# Altium footprint library PcbLib1.PcbLib: 28 footprints (part 1 of 2)
Each footprint in its own frame and in the unit in brackets; x right, y up, seen from the top. Pads: shape width x height; smd on the part's side, far side on the other; paste and mask are expansions set on the pad; w line width, h text height; cw(c..) or ccw(c..) is an arc to the next point about the centre after c.
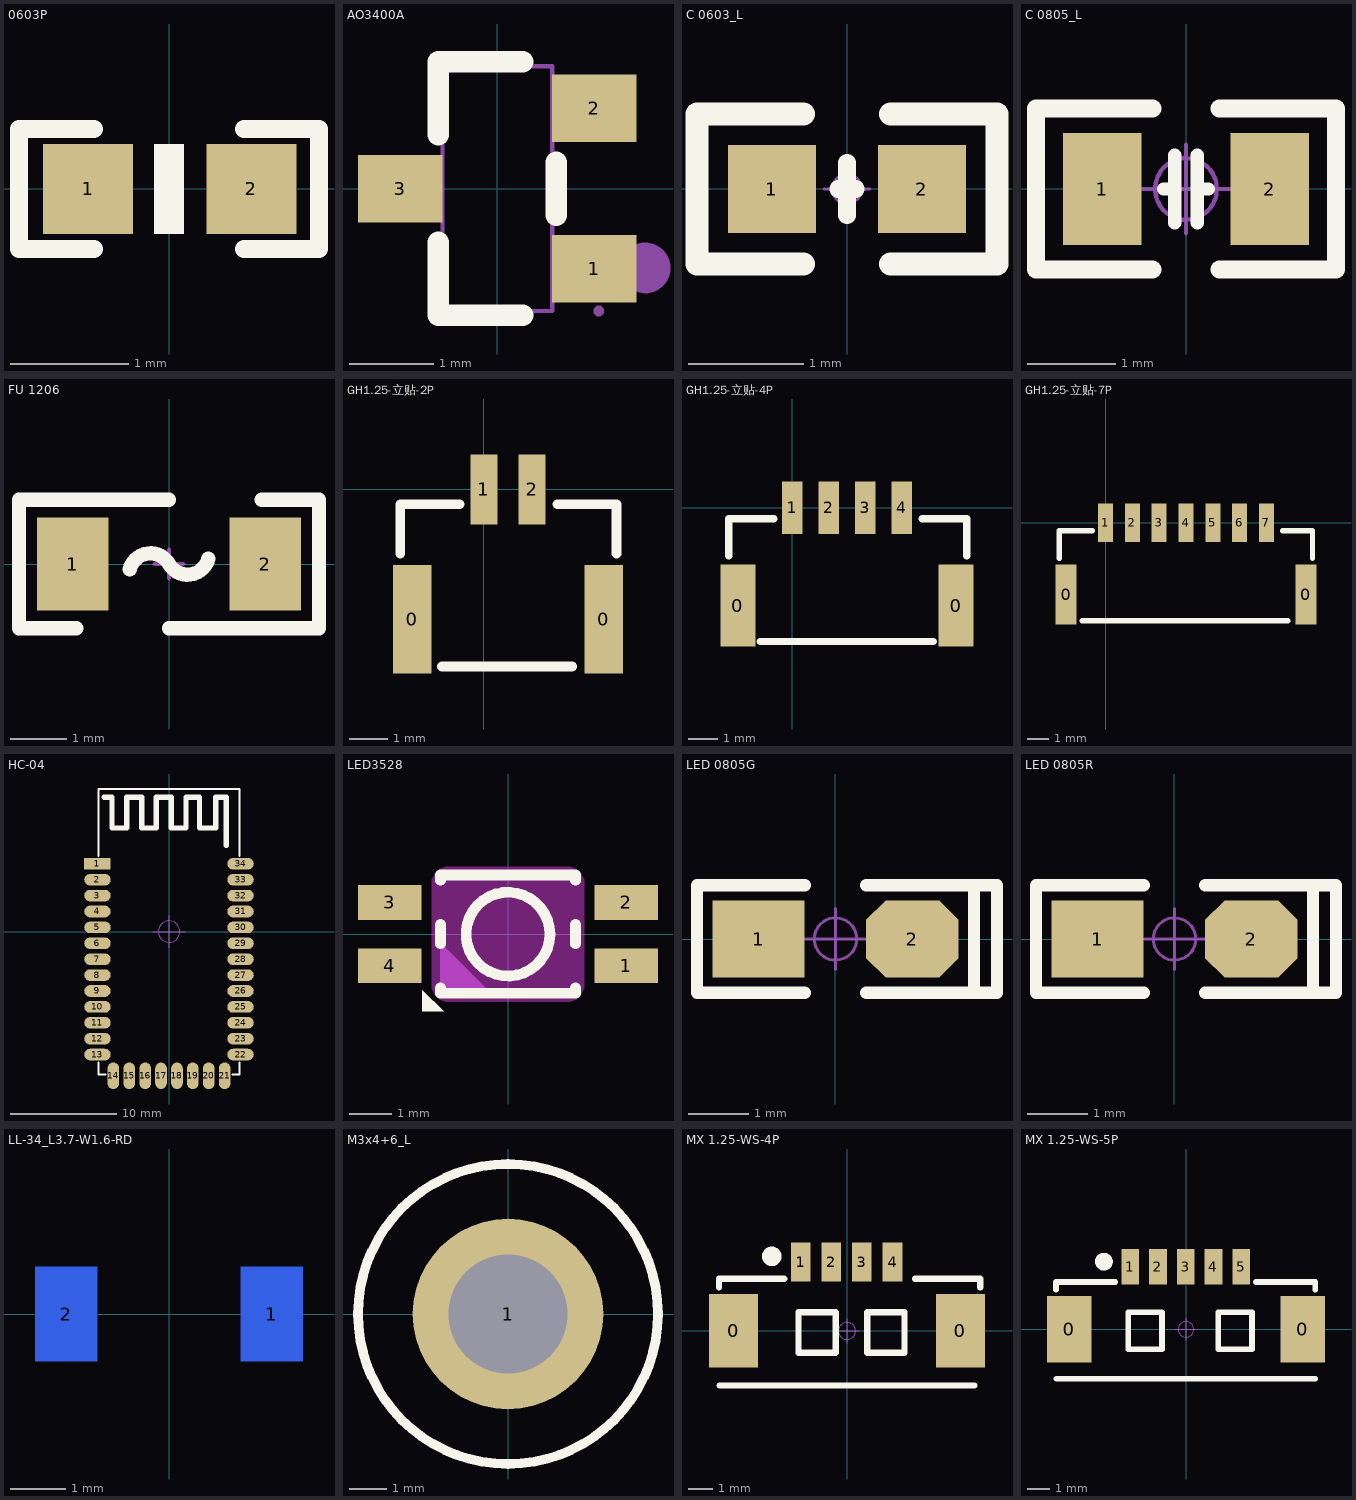
[diagram p0: the footprints below, top view; thin cyan lines are the x and y axes]

## 0603P [mil]
height 393.7
pads (2):
  rect 30x30 smd: 1(-27,0) 2(27.5,-0.06)
Top Overlay:
  region: 5,-15.06 5,14.94 -5,14.94 -5,-15.06
  lines w6: -25,-20.06 -50,-20.06 -50,19.94 -25,19.94 ; 25,-20.06 50,-20.06 50,19.94 25,19.94

## AO3400A [mm] "SOT-23_L2.9-W1.3-P1.90-LS2.4-BR"
pads (3):
  rect 1x0.8 smd mask+0.051: 1(1.15,-0.95) 2(1.15,0.95) 3(-1.15,0)
Top Overlay:
  lines w0.254: -0.7,-0.636 -0.7,-1.5 0.3,-1.5 ; -0.7,0.636 -0.7,1.5 0.3,1.5 ; 0.7,-0.314 0.7,0.314
Mechanical 6:
  circle w0.3: c1.753,-0.94 r0.15
Mechanical 15:
  region: -1.2,-0.2 -1.2,0.2 -0.8,0.2 -0.8,-0.2
  region: -0.81,-0.2 -0.81,0.2 -0.64,0.2 -0.64,-0.2
  region: 0.8,0.75 0.8,1.15 1.2,1.15 1.2,0.75
  region: 0.64,0.75 0.64,1.15 0.81,1.15 0.81,0.75
  region: 0.8,-1.15 0.8,-0.75 1.2,-0.75 1.2,-1.15
  region: 0.64,-1.15 0.64,-0.75 0.81,-0.75 0.81,-1.15
  region: 1.26,-1.45 1.26,-1.425 1.225,-1.39 1.175,-1.39 1.14,-1.425 1.14,-1.45 1.14,-1.475 1.175,-1.51 1.225,-1.51 1.26,-1.475
  lines w0.051: -0.65,-1.45 0.65,-1.45 0.65,1.45 -0.65,1.45 -0.65,-1.45
3D body "SOT-23-3L_AOS.step": height 1.25, standoff 0, extent -1.499,-1.549 1.499,1.549

## C 0603_L [mil] "无极性贴片电容                                       淘宝ID:黄晶宝石"
height 393.7
pads (2):
  rect 30x30 smd: 1(-25.59,0) 2(25.59,0)
Top Overlay:
  lines w6: -3,0 0,0 3,0 ; 0,-9 0,9
  lines w8: -15,-25.59 -51.18,-25.59 -51.18,25.59 -15,25.59 ; 15,-25.59 51.18,-25.59 51.18,25.59 15,25.59
Mechanical 15:
  circle w1: c0,0 r5
  lines w1: -7.87,0 7.87,0 ; 0,-7.87 0,7.87
3D body "C 0603.STEP": height 31.89, standoff -0.39, extent -31.5,-16.14 31.5,16.14

## C 0805_L [mil] "无极性贴片电容                                        淘宝ID:黄晶宝石"
height 19.68
pads (2):
  rect 35x50 smd: 1(-37.4,0) 2(37.4,0)
Top Overlay:
  lines w6: -10,0 -5,0 ; -5,-15 -5,15 ; 5,-15 5,15 ; 5,0 10,0
  lines w8: -15,-36 -66.93,-36 -66.93,36 -15,36 ; 15,-36 66.93,-36 66.93,36 15,36
Mechanical 15:
  circle w1.97: c0,0 r13.78
  circle w1.97: c0,0 r13.78
  lines w1.97: -19.68,0 19.68,0 -19.68,0 ; 0,-19.68 0,19.68 0,-19.68
3D body "C 0805.STEP": height 20.08, standoff -0.39, extent -39.37,-24.02 39.37,24.02

## FU 1206 [mil] "贴片保险丝"
height 177.17
pads (2):
  rect 50x65 smd: 1(-67.5,0) 2(67.5,0)
Top Overlay:
  lines w10: -90,45 0,45 ; -65,-45 -105,-45 -105,45 -65,45 ; -27.48,-3.62 cw(c-12.99,-7.5) 0,0 ccw(c12.99,7.5) 27.48,3.62 ; 0,-45 90,-45 ; 65,-45 105,-45 105,45 65,45
Mechanical 15:
  lines w3: -10,0 10,0 ; 0,-10 0,10
3D body "FU 01206.STEP": height 34.25, standoff 0, extent -62.99,-31.89 62.99,31.89

## GH1.25-立贴-2P [mm]
pads (4):
  rect 1x2.8 smd: 0(-1.85,-3.35) 0(3.1,-3.35)
  rect 0.7x1.8 smd: 1(0,0) 2(1.25,0)
Top Overlay:
  lines w0.254: -2.159,-1.651 -2.159,-0.381 -0.625,-0.381 ; -1.082,-4.572 2.286,-4.572 ; 1.905,-0.381 3.429,-0.381 3.429,-1.651
3D body "MOLEX1.25-LS-2P.STEP": height 4.7, standoff 0, extent -3.19,-4.33 4.46,-0.23

## GH1.25-立贴-4P [mm]
height 10
pads (6):
  rect 1.2x2.8 smd: 0(-1.85,-3.35) 0(5.6,-3.35)
  rect 0.7x1.8 smd: 1(0,0) 2(1.25,0) 3(2.5,0) 4(3.75,0)
Top Overlay:
  lines w0.254: -2.159,-1.651 -2.159,-0.381 -0.625,-0.381 ; -1.082,-4.572 4.826,-4.572 ; 4.445,-0.381 5.969,-0.381 5.969,-1.651
3D body "MOLEX1.25-LS-4P.STEP": height 4.7, standoff 0, extent -3.233,-4.076 6.917,0.024

## GH1.25-立贴-7P [mm]
pads (9):
  rect 1x2.8 smd: 0(-1.85,-3.35) 0(9.35,-3.35)
  rect 0.7x1.8 smd: 1(0,0) 2(1.25,0) 3(2.5,0) 4(3.75,0) 5(5,0) 6(6.25,0) 7(7.5,0)
Top Overlay:
  lines w0.254: -2.159,-1.651 -2.159,-0.381 -0.625,-0.381 ; -1.082,-4.572 8.509,-4.572 ; 8.255,-0.381 9.652,-0.381 9.652,-1.651
3D body "MOLEX1.25-LS-7P.STEP": height 4.7, standoff 0, extent -3.204,-4.14 10.697,-0.04

## HC-04 [mm] "串口蓝牙模块"
height 10
pads (34):
  rect 2.5x1.1 smd: 1(-6.75,6.403)
  oval 2.5x1.1 smd: 2(-6.75,4.903) 3(-6.75,3.403) 4(-6.75,1.903) 5(-6.75,0.403) 6(-6.75,-1.097) 7(-6.75,-2.597) 8(-6.75,-4.097) 9(-6.75,-5.597) 10(-6.75,-7.097) 11(-6.75,-8.597) 12(-6.75,-10.097) 13(-6.75,-11.597) 22(6.75,-11.597) 23(6.75,-10.097) 24(6.75,-8.597) 25(6.75,-7.097) 26(6.75,-5.597) 27(6.75,-4.097) 28(6.75,-2.597) 29(6.75,-1.097) 30(6.75,0.403) 31(6.75,1.903) 32(6.75,3.403) 33(6.75,4.903) 34(6.75,6.403)
  oval 1.1x2.5 smd: 14(-5.25,-13.597) 15(-3.75,-13.597) 16(-2.25,-13.597) 17(-0.75,-13.597) 18(0.75,-13.597) 19(2.25,-13.597) 20(3.75,-13.597) 21(5.25,-13.597)
Top Overlay:
  lines w0.203: -6.647,-12.37 -6.647,-13.487 -6.012,-13.487 ; -6.647,7.163 -6.647,13.462 6.637,13.462 6.637,7.163 ; 6.002,-13.487 6.637,-13.487 6.637,-12.37
  lines w0.508: -6.139,12.7 -5.377,12.7 -5.377,9.779 -3.98,9.779 -3.98,12.7 -2.583,12.7 -2.583,9.779 -1.186,9.779 -1.186,12.7 0.211,12.7 0.211,9.779 1.608,9.779 1.608,12.7 2.878,12.7 2.878,9.779 4.402,9.779 4.402,12.7 5.418,12.7 5.418,8.128
Mechanical 15:
  circle w0.1: c0,0.003 r1.016
  lines w0.1: -1.524,0.003 1.524,0.003 ; 0,-1.521 0,1.527
3D body "HC-05.STEP": height 2.46, standoff -0.01, extent -6.52,-13.367 6.52,13.353

## LED3528 [mm]
pads (4):
  rect 1.5x0.82 smd: 1(2.8,-0.75) 2(2.8,0.75) 3(-2.8,0.75) 4(-2.8,-0.75)
Top Overlay:
  circle w0.254: c0,0 r0.992
  region: -2.03,-1.83 -2.03,-1.322 -1.522,-1.83
  lines w0.254: -1.6,-1.273 -1.6,-1.4 1.6,-1.4 1.6,-1.273 ; -1.6,-0.227 -1.6,0.227 ; -1.6,1.273 -1.6,1.4 1.6,1.4 1.6,1.273 ; 1.6,-0.227 1.6,0.227
Keep-Out Layer:
  board cut-out: -1.4,-1.6 -1.413,-1.6 -1.412,-1.6 -1.41,-1.6 -1.409,-1.6 -1.407,-1.6 -1.406,-1.6 -1.404,-1.6 -1.402,-1.6 -1.401,-1.6
  board cut-out: 1.8,-1.2 1.8,-1.28 1.739,-1.427 1.627,-1.539 1.48,-1.6 1.4,-1.6 -1.4,-1.6 -1.401,-1.6 -1.402,-1.6 -1.404,-1.6 -1.406,-1.6 -1.485,-1.599 -1.63,-1.537 -1.74,-1.425 -1.8,-1.279 -1.8,-1.2 -1.8,1.2 -1.8,1.28 -1.739,1.427 -1.627,1.539 -1.48,1.6 -1.4,1.6 1.4,1.6 1.48,1.6 1.627,1.539 1.739,1.427 1.8,1.28 1.8,1.2
Mechanical 15:
  region: -1.6,-1.4 -0.4,-1.4 -1.6,-0.2

## LED 0805G [mil] "绿色0805LED                              淘宝ID:黄晶宝石"
height 177.17
pads (2):
  rect 60x50 smd: 1(-50,0)
  oct 60x50 smd: 2(50,0)
Top Overlay:
  lines w8: -20,-35 -90,-35 -90,35 -20,35 ; 20,-35 105,-35 105,35 20,35 ; 90,-35 90,35
Mechanical 15:
  circle w1.97: c0,0 r13.78
  lines w1.97: -19.68,0 19.68,0 ; 0,-19.68 0,19.68
3D body "LED 0805-G.STEP": height 26.33, standoff -0.16, extent -39.37,-24.65 39.37,24.65
3D body "LED 0805玻璃罩.ST": height 0, standoff 0, extent 0,0 0,0

## LED 0805R [mil] "红色0805LED                                       淘宝ID:黄晶宝石"
height 393.7
pads (2):
  rect 60x50 smd: 1(-50,0)
  oct 60x50 smd: 2(50,0)
Top Overlay:
  lines w8: -20,-35 -90,-35 -90,35 -20,35 ; 20,-35 105,-35 105,35 20,35 ; 90,-35 90,35
Mechanical 15:
  circle w1.97: c0,0 r13.78
  lines w1.97: -19.68,0 19.68,0 ; 0,-19.68 0,19.68
3D body "LED 0805-R.STEP": height 26.33, standoff -0.16, extent -39.37,-24.65 39.37,24.64
3D body "LED 0805玻璃罩.ST": height 31.69, standoff 12.01, extent -29.49,-25 29.49,24.29

## LL-34_L3.7-W1.6-RD [mil]
pads (2):
  rect 44x67 smd far side: 1(73,0) 2(-73,0)
Bottom Overlay:
  lines w10: -39.16,-27 41.16,-27 ; -39.16,-24.8 -39.16,24.8 ; -39.16,28 41.16,28 ; -19,-24.8 -19,24.8 ; 41,-25 41,24.8
3D body "User Library-SOD80C-1.STEP": height 62.99, standoff 0, extent -67.83,-29 77.83,34

## M3x4+6_L [mm] "M3铜柱，长：4mm，螺纹长：6mm"
height 10
pads (1):
  round 5.08 hole 3.175: 1(0,0)
Top Overlay:
  circle w0.254: c0,0 r4
3D body "M3x4+6.STEP": height 4.05, standoff -5.95, extent -2.698,-2.35 2.698,2.35

## MX 1.25-WS-4P [mm] "长：10.15mm，宽：4.2mm，高：3.4mm"
height 10
pads (6):
  rect 2x3 smd: 0(-4.632,0) 0(4.632,0)
  rect 0.8x1.6 smd: 1(-1.889,2.811) 2(-0.639,2.811) 3(0.611,2.811) 4(1.861,2.811)
Top Overlay:
  circle w0.4: c-3.074,3.048 r0.2
  lines w0.254: -5.233,1.778 -5.233,2.134 -2.566,2.134 ; -5.206,-2.228 5.201,-2.228 ; 2.782,2.134 5.449,2.134 5.449,1.778 ; -1.982,-0.889 -0.458,-0.889 -0.458,0.762 -1.982,0.762 -1.982,-0.889 ; 0.826,-0.889 2.35,-0.889 2.35,0.762 0.826,0.762 0.826,-0.889
Mechanical 15:
  circle w0.05: c0,0 r0.35
  lines w0.05: -0.5,0 0.5,0 ; 0,-0.5 0,0.5
3D body "MOLEX1.25-WS-4P.STEP": height 3.4, standoff 0, extent -5.075,-2.1 5.075,3.09

## MX 1.25-WS-5P [mm] "长：11.4mm，宽：4.2mm，高：3.4mm"
pads (7):
  rect 2x3 smd: 0(-5.257,0) 0(5.257,0)
  rect 0.8x1.6 smd: 1(-2.514,2.811) 2(-1.264,2.811) 3(-0.014,2.811) 4(1.236,2.811) 5(2.486,2.811)
Top Overlay:
  circle w0.4: c-3.699,3.048 r0.2
  lines w0.254: -5.858,1.778 -5.858,2.134 -3.191,2.134 ; -5.831,-2.228 5.826,-2.228 ; 3.153,2.134 5.82,2.134 5.82,1.778 ; -2.607,-0.889 -2.607,0.762 -1.083,0.762 -1.083,-0.889 -2.607,-0.889 ; 1.451,-0.889 1.451,0.762 2.975,0.762 2.975,-0.889 1.451,-0.889
Mechanical 15:
  circle w0.05: c0,0 r0.35
  lines w0.05: -0.5,0 0.5,0 ; 0,-0.5 0,0.5
3D body "MOLEX1.25-WS-5P.STEP": height 3.4, standoff 0, extent -5.7,-2.1 5.7,3.09